# Altium footprint library Metric_SMD.PcbLib: 185 footprints (part 3 of 12)
Each footprint in its own frame and in the unit in brackets; x right, y up, seen from the top. Pads: shape width x height; smd on the part's side, far side on the other; paste and mask are expansions set on the pad; w line width, h text height; cw(c..) or ccw(c..) is an arc to the next point about the centre after c.
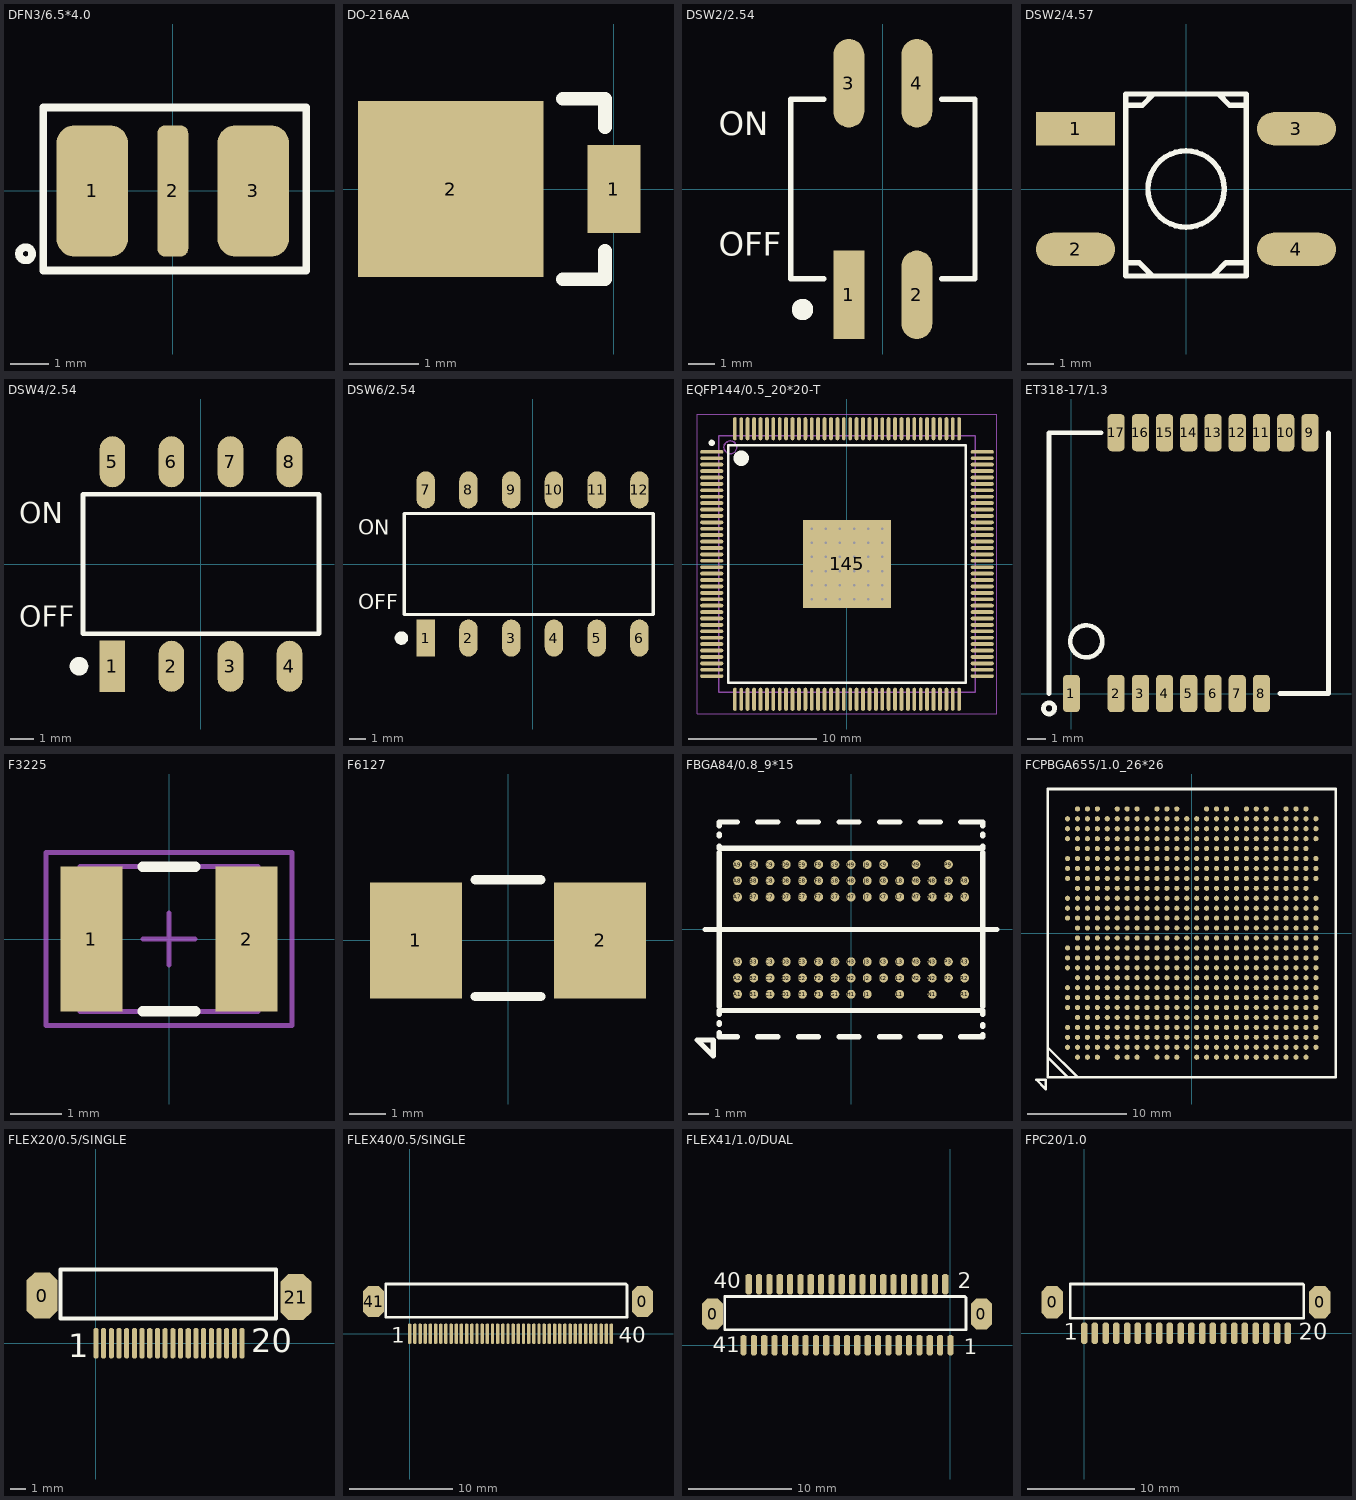
[diagram p2: the footprints below, top view; thin cyan lines are the x and y axes]

## DFN3/6.5*4.0 [mm] "TBU高速保护管,6.5*4.0mm,3pin"
height 0.9
pads (3):
  rrect50% 1.85x3.4 smd: 1(-2.083,0) 3(2.083,0)
  rrect50% 0.8x3.4 smd: 2(0,0)
Top Overlay:
  circle w0.2: c-3.81,-1.626 r0.17
  lines w0.2: -3.353,-2.057 3.454,-2.057 3.454,2.159 -3.353,2.159 -3.353,-2.057
3D body: height 2.2, standoff 0.2, extent -3.245,-1.88 3.327,1.956

## DO-216AA [mm]
pads (2):
  rect 0.762x1.27 smd: 1(0,0)
  rect 2.67x2.54 smd: 2(-2.351,0)
Top Overlay:
  lines w0.2: -0.737,-1.3 -0.127,-1.3 -0.127,-0.889 ; -0.737,1.3 -0.127,1.3 -0.127,0.889

## DSW2/2.54 [mm]
height 4.4
pads (4):
  rect 1.15x3.3 smd: 1(-1.27,-3.95)
  oval 1.15x3.3 smd: 2(1.27,-3.95) 3(-1.27,3.95) 4(1.27,3.95)
Top Overlay:
  circle w0.4: c-3,-4.5 r0.2
  lines w0.2: -2.2,-3.35 -3.44,-3.35 -3.44,3.35 -2.2,3.35 ; 2.2,-3.35 3.44,-3.35 3.44,3.35 2.2,3.35
  text "OFF" at -6.119,-2.5 h0.89
  text "ON" at -6.119,2 h0.89

## DSW2/4.57 [mil]
pads (4):
  rect 118.11x49.37 smd: 1(-165,90)
  oval 118.11x49.37 smd: 2(-165,-90) 3(165,90) 4(165,-90)
Top Overlay:
  circle w7.87: c0.08,0 r57.01
  lines w7.87: -89.99,-110 -70,-110 -50,-130 ; -89.99,125 -65.39,125 -49.28,141.1 ; -89.99,140.39 -89.99,-130 90.01,-130 90.01,141.81 -89.99,141.81 ; 42.31,-127.3 59.62,-110 90.01,-110 ; 49.3,141.1 65.4,125 90.01,125
3D body "User Library-KT11P2SM.STEP": height 216.54, standoff -1.14, extent -195.12,-125.73 199.91,124.02

## DSW4/2.54 [mm] "Body 10.16*6mm"
height 4.55
pads (8):
  rect 1.1x2.2 smd: 1(-3.81,-4.4)
  oval 1.1x2.2 smd: 2(-1.27,-4.4) 3(1.27,-4.4) 4(3.81,-4.4) 5(-3.81,4.4) 6(-1.27,4.4) 7(1.27,4.4) 8(3.81,4.4)
Top Overlay:
  circle w0.4: c-5.25,-4.4 r0.2
  lines w0.2: -5.08,-3 -5.08,3 5.08,3 5.08,-3 -5.08,-3
  text "OFF" at -7.832,-2.7 h0.89
  text "ON" at -7.832,1.75 h0.89

## DSW6/2.54 [mm] "Body 15.24*6mm"
height 4.55
pads (12):
  rect 1.1x2.2 smd: 1(-6.35,-4.4)
  oval 1.1x2.2 smd: 2(-3.81,-4.4) 3(-1.27,-4.4) 4(1.27,-4.4) 5(3.81,-4.4) 6(6.35,-4.4) 7(-6.35,4.4) 8(-3.81,4.4) 9(-1.27,4.4) 10(1.27,4.4) 11(3.81,4.4) 12(6.35,4.4)
Top Overlay:
  circle w0.4: c-7.79,-4.4 r0.2
  lines w0.2: -7.62,-3 -7.62,3 7.17,3 7.17,-3 -7.62,-3
  text "OFF" at -10.372,-2.7 h0.89
  text "ON" at -10.372,1.75 h0.89

## EQFP144/0.5_20*20-T [mm] "Shrink QFP, 144-Leads, Body 20x20mm, Pitch 0.5mm, Thermal Pad 6.85x6.85mm, IPC Medium Density"
height 1.65
pads (145):
  oval 1.8x0.3 smd: 1(-10.55,8.75) 2(-10.55,8.25) 3(-10.55,7.75) 4(-10.55,7.25) 5(-10.55,6.75) 6(-10.55,6.25) 7(-10.55,5.75) 8(-10.55,5.25) 9(-10.55,4.75) 10(-10.55,4.25) 11(-10.55,3.75) 12(-10.55,3.25) 13(-10.55,2.75) 14(-10.55,2.25) 15(-10.55,1.75) 16(-10.55,1.25) 17(-10.55,0.75) 18(-10.55,0.25) 19(-10.55,-0.25) 20(-10.55,-0.75) 21(-10.55,-1.25) 22(-10.55,-1.75) 23(-10.55,-2.25) 24(-10.55,-2.75) 25(-10.55,-3.25) 26(-10.55,-3.75) 27(-10.55,-4.25) 28(-10.55,-4.75) 29(-10.55,-5.25) 30(-10.55,-5.75) 31(-10.55,-6.25) 32(-10.55,-6.75) 33(-10.55,-7.25) 34(-10.55,-7.75) 35(-10.55,-8.25) 36(-10.55,-8.75) 73(10.55,-8.75) 74(10.55,-8.25) 75(10.55,-7.75) 76(10.55,-7.25) 77(10.55,-6.75) 78(10.55,-6.25) 79(10.55,-5.75) 80(10.55,-5.25) 81(10.55,-4.75) 82(10.55,-4.25) 83(10.55,-3.75) 84(10.55,-3.25) 85(10.55,-2.75) 86(10.55,-2.25) 87(10.55,-1.75) 88(10.55,-1.25) 89(10.55,-0.75) 90(10.55,-0.25) 91(10.55,0.25) 92(10.55,0.75) 93(10.55,1.25) 94(10.55,1.75) 95(10.55,2.25) 96(10.55,2.75) 97(10.55,3.25) 98(10.55,3.75) 99(10.55,4.25) 100(10.55,4.75) 101(10.55,5.25) 102(10.55,5.75) 103(10.55,6.25) 104(10.55,6.75) 105(10.55,7.25) 106(10.55,7.75) 107(10.55,8.25) 108(10.55,8.75)
  oval 0.3x1.8 smd: 37(-8.75,-10.55) 38(-8.25,-10.55) 39(-7.75,-10.55) 40(-7.25,-10.55) 41(-6.75,-10.55) 42(-6.25,-10.55) 43(-5.75,-10.55) 44(-5.25,-10.55) 45(-4.75,-10.55) 46(-4.25,-10.55) 47(-3.75,-10.55) 48(-3.25,-10.55) 49(-2.75,-10.55) 50(-2.25,-10.55) 51(-1.75,-10.55) 52(-1.25,-10.55) 53(-0.75,-10.55) 54(-0.25,-10.55) 55(0.25,-10.55) 56(0.75,-10.55) 57(1.25,-10.55) 58(1.75,-10.55) 59(2.25,-10.55) 60(2.75,-10.55) 61(3.25,-10.55) 62(3.75,-10.55) 63(4.25,-10.55) 64(4.75,-10.55) 65(5.25,-10.55) 66(5.75,-10.55) 67(6.25,-10.55) 68(6.75,-10.55) 69(7.25,-10.55) 70(7.75,-10.55) 71(8.25,-10.55) 72(8.75,-10.55) 109(8.75,10.55) 110(8.25,10.55) 111(7.75,10.55) 112(7.25,10.55) 113(6.75,10.55) 114(6.25,10.55) 115(5.75,10.55) 116(5.25,10.55) 117(4.75,10.55) 118(4.25,10.55) 119(3.75,10.55) 120(3.25,10.55) 121(2.75,10.55) 122(2.25,10.55) 123(1.75,10.55) 124(1.25,10.55) 125(0.75,10.55) 126(0.25,10.55) 127(-0.25,10.55) 128(-0.75,10.55) 129(-1.25,10.55) 130(-1.75,10.55) 131(-2.25,10.55) 132(-2.75,10.55) 133(-3.25,10.55) 134(-3.75,10.55) 135(-4.25,10.55) 136(-4.75,10.55) 137(-5.25,10.55) 138(-5.75,10.55) 139(-6.25,10.55) 140(-6.75,10.55) 141(-7.25,10.55) 142(-7.75,10.55) 143(-8.25,10.55) 144(-8.75,10.55)
  rect 6.85x6.85 smd: 145(0,0)
via 2.75,-2.75 diameter 0.5 hole 0.2
via 1.65,-2.75 diameter 0.5 hole 0.2
via 0.55,-2.75 diameter 0.5 hole 0.2
via -0.55,-2.75 diameter 0.5 hole 0.2
via -1.65,-2.75 diameter 0.5 hole 0.2
via -2.75,-2.75 diameter 0.5 hole 0.2
via 2.75,-1.65 diameter 0.5 hole 0.2
via 1.65,-1.65 diameter 0.5 hole 0.2
via 0.55,-1.65 diameter 0.5 hole 0.2
via -0.55,-1.65 diameter 0.5 hole 0.2
via -1.65,-1.65 diameter 0.5 hole 0.2
via -2.75,-1.65 diameter 0.5 hole 0.2
via 2.75,-0.55 diameter 0.5 hole 0.2
via 1.65,-0.55 diameter 0.5 hole 0.2
via 0.55,-0.55 diameter 0.5 hole 0.2
via -0.55,-0.55 diameter 0.5 hole 0.2
via -1.65,-0.55 diameter 0.5 hole 0.2
via -2.75,-0.55 diameter 0.5 hole 0.2
via 2.75,0.55 diameter 0.5 hole 0.2
via 1.65,0.55 diameter 0.5 hole 0.2
via 0.55,0.55 diameter 0.5 hole 0.2
via -0.55,0.55 diameter 0.5 hole 0.2
via -1.65,0.55 diameter 0.5 hole 0.2
via -2.75,0.55 diameter 0.5 hole 0.2
via 2.75,1.65 diameter 0.5 hole 0.2
via 1.65,1.65 diameter 0.5 hole 0.2
via 0.55,1.65 diameter 0.5 hole 0.2
via -0.55,1.65 diameter 0.5 hole 0.2
via -1.65,1.65 diameter 0.5 hole 0.2
via -2.75,1.65 diameter 0.5 hole 0.2
via 2.75,2.75 diameter 0.5 hole 0.2
via 1.65,2.75 diameter 0.5 hole 0.2
via 0.55,2.75 diameter 0.5 hole 0.2
via -0.55,2.75 diameter 0.5 hole 0.2
via -1.65,2.75 diameter 0.5 hole 0.2
via -2.75,2.75 diameter 0.5 hole 0.2
Top Overlay:
  circle w0.25: c-10.55,9.45 r0.125
  circle w0.6: c-8.25,8.25 r0.3
  lines w0.2: -9.25,-9.25 -9.25,9.25 9.25,9.25 9.25,-9.25 -9.25,-9.25
Mechanical 13:
  circle w0.1: c-9.1,9.1 r0.5
  lines w0.1: -10,-10 -10,10 10,10 10,-10 -10,-10
Mechanical 15:
  lines w0.05: -11.7,-11.7 -11.7,11.7 11.7,11.7 11.7,-11.7 -11.7,-11.7
  lines w0.1: -0.5,0 0.5,0 ; 0,-0.5 0,0.5
3D body: height 1.65, standoff 0.05, extent -10,-10 10,10

## ET318-17/1.3 [mm] "ET318 GPS模块pitch=1.3mm"
height 1
pads (17):
  rrect50% 0.92x2 smd: 1(0,0) 2(2.4,0) 3(3.7,0) 4(5,0) 5(6.3,0) 6(7.6,0) 7(8.9,0) 8(10.2,0) 9(12.8,14) 10(11.5,14) 11(10.2,14) 12(8.9,14) 13(7.6,14) 14(6.3,14) 15(5,14) 16(3.7,14) 17(2.4,14)
Top Overlay:
  circle w0.254: c0.8,2.8 r0.86
  lines w0.254: -1.2,0 -1.2,14 1.6,14 ; -0.901,-0.773 ccw(c-1.2,-0.8) -0.9,-0.8 ; 11.2,0 13.8,0 13.8,14
3D body: height 1, standoff 0.01, extent -1.1,0.1 13.7,13.9
3D body: height 1.02, standoff 0.01, extent 3.19,7.3 9.9,11.046

## F3225 [mm] "Body 3.43*2.8(MAX)"
height 0.85
pads (2):
  rect 1.2x2.8 smd: 1(-1.5,0) 2(1.5,0)
Top Overlay:
  lines w0.2: -0.508,-1.4 0.508,-1.4 ; -0.508,1.4 0.508,1.4
Mechanical 13:
  lines w0.1: -1.715,-1.4 -1.715,1.4 1.715,1.4 1.715,-1.4 -1.715,-1.4
Mechanical 15:
  lines w0.1: -0.5,0 0.5,0 ; 0,-0.5 0,0.5 ; -2.375,-1.675 -2.375,1.675 2.375,1.675 2.375,-1.675 -2.375,-1.675
3D body: height 0.85, standoff 0, extent -1.715,-1.4 1.715,1.4

## F6127 [mm] "Body 6.1*2.69"
height 2.94
pads (2):
  rect 2.5x3.15 smd: 1(-2.5,0) 2(2.5,0)
Top Overlay:
  lines w0.254: -0.889,-1.524 0.889,-1.524 ; -0.889,1.651 0.889,1.651
3D body "User Library-FUSE_NANO2.STEP": height 2.7, standoff 0, extent -3.01,-1.34 3.09,1.36

## FBGA84/0.8_9*15 [mm] "0.8mm间距"
height 1.5
pads (84):
  round 0.44 smd: A1(-5.6,-3.2) A2(-5.6,-2.4) A3(-5.6,-1.6) A7(-5.6,1.6) A8(-5.6,2.4) A9(-5.6,3.2) B1(-4.8,-3.2) B2(-4.8,-2.4) B3(-4.8,-1.6) B7(-4.8,1.6) B8(-4.8,2.4) B9(-4.8,3.2) C1(-4,-3.2) C2(-4,-2.4) C3(-4,-1.6) C7(-4,1.6) C8(-4,2.4) C9(-4,3.2) D1(-3.2,-3.2) D2(-3.2,-2.4) D3(-3.2,-1.6) D7(-3.2,1.6) D8(-3.2,2.4) D9(-3.2,3.2) E1(-2.4,-3.2) E2(-2.4,-2.4) E3(-2.4,-1.6) E7(-2.4,1.6) E8(-2.4,2.4) E9(-2.4,3.2) F1(-1.6,-3.2) F2(-1.6,-2.4) F3(-1.6,-1.6) F7(-1.6,1.6) F8(-1.6,2.4) F9(-1.6,3.2) G1(-0.8,-3.2) G2(-0.8,-2.4) G3(-0.8,-1.6) G7(-0.8,1.6) G8(-0.8,2.4) G9(-0.8,3.2) H1(0,-3.2) H2(0,-2.4) H3(0,-1.6) H7(0,1.6) H8(0,2.4) H9(0,3.2) J1(0.8,-3.2) J2(0.8,-2.4) J3(0.8,-1.6) J7(0.8,1.6) J8(0.8,2.4) J9(0.8,3.2) K2(1.6,-2.4) K3(1.6,-1.6) K7(1.6,1.6) K8(1.6,2.4) K9(1.6,3.2) L1(2.4,-3.2) L2(2.4,-2.4) L3(2.4,-1.6) L7(2.4,1.6) L8(2.4,2.4) M2(3.2,-2.4) M3(3.2,-1.6) M7(3.2,1.6) M8(3.2,2.4) M9(3.2,3.2) N1(4,-3.2) N2(4,-2.4) N3(4,-1.6) N7(4,1.6) N8(4,2.4) P2(4.8,-2.4) P3(4.8,-1.6) P7(4.8,1.6) P8(4.8,2.4) P9(4.8,3.2) R1(5.6,-3.2) R2(5.6,-2.4) R3(5.6,-1.6) R7(5.6,1.6) R8(5.6,2.4)
Top Overlay:
  lines w0.254: -7.2,0 7.2,0 ; -6.5,-5.1 -6.5,-5.3 -5.6,-5.3 ; -6.5,-4.7 -6.5,-4.6 ; -6.5,-4.2 -6.5,-4 6.5,-4 6.5,-4.2 ; -6.5,-3.8 -6.5,3.8 ; -6.5,4.1 -6.5,4 6.5,4 6.5,4.1 ; -6.5,4.6 -6.5,4.7 ; -6.5,5.1 -6.5,5.3 -5.6,5.3 ; -4.6,-5.3 -3.6,-5.3 ; -4.6,5.3 -3.6,5.3 ; -2.6,-5.3 -1.6,-5.3 ; -2.6,5.3 -1.6,5.3 ; -0.6,-5.3 0.4,-5.3 ; -0.6,5.3 0.4,5.3 ; 1.4,-5.3 2.4,-5.3 ; 1.4,5.3 2.4,5.3 ; 3.4,-5.3 4.4,-5.3 ; 3.4,5.3 4.4,5.3 ; 5.4,-5.3 6.5,-5.3 6.5,-5.2 ; 5.4,5.3 6.5,5.3 6.5,5.1 ; 6.5,-4.8 6.5,-4.7 ; 6.5,-3.8 6.5,3.8 ; 6.5,4.6 6.5,4.7 ; -7.6,-5.45 -6.8,-6.25 -6.8,-5.45 -7.6,-5.45
3D body: height 1.6, standoff 0.2, extent -6.5,-5.3 6.5,5.3

## FCPBGA655/1.0_26*26 [mm] "1mm间距,27x27"
height 1
pads (655):
  round 0.52 smd: A2(-12.5,-11.5) A3(-12.5,-10.5) A4(-12.5,-9.5) A6(-12.5,-7.5) A7(-12.5,-6.5) A8(-12.5,-5.5) A10(-12.5,-3.5) A11(-12.5,-2.5) A12(-12.5,-1.5) A15(-12.5,1.5) A16(-12.5,2.5) A17(-12.5,3.5) A19(-12.5,5.5) A20(-12.5,6.5) A21(-12.5,7.5) A23(-12.5,9.5) A24(-12.5,10.5) A25(-12.5,11.5) AA1(7.5,-12.5) AA2(7.5,-11.5) AA3(7.5,-10.5) AA4(7.5,-9.5) AA5(7.5,-8.5) AA6(7.5,-7.5) AA7(7.5,-6.5) AA8(7.5,-5.5) AA9(7.5,-4.5) AA10(7.5,-3.5) AA11(7.5,-2.5) AA12(7.5,-1.5) AA13(7.5,-0.5) AA14(7.5,0.5) AA15(7.5,1.5) AA16(7.5,2.5) AA17(7.5,3.5) AA18(7.5,4.5) AA19(7.5,5.5) AA20(7.5,6.5) AA21(7.5,7.5) AA22(7.5,8.5) AA23(7.5,9.5) AA24(7.5,10.5) AA25(7.5,11.5) AA26(7.5,12.5) AB1(8.5,-12.5) AB2(8.5,-11.5) AB3(8.5,-10.5) AB4(8.5,-9.5) AB5(8.5,-8.5) AB6(8.5,-7.5) AB7(8.5,-6.5) AB8(8.5,-5.5) AB9(8.5,-4.5) AB10(8.5,-3.5) AB11(8.5,-2.5) AB12(8.5,-1.5) AB13(8.5,-0.5) AB14(8.5,0.5) AB15(8.5,1.5) AB16(8.5,2.5) AB17(8.5,3.5) AB18(8.5,4.5) AB19(8.5,5.5) AB20(8.5,6.5) AB21(8.5,7.5) AB22(8.5,8.5) AB23(8.5,9.5) AB24(8.5,10.5) AB25(8.5,11.5) AC1(9.5,-12.5) AC2(9.5,-11.5) AC3(9.5,-10.5) AC4(9.5,-9.5) AC5(9.5,-8.5) AC6(9.5,-7.5) AC7(9.5,-6.5) AC8(9.5,-5.5) AC9(9.5,-4.5) AC10(9.5,-3.5) AC11(9.5,-2.5) AC12(9.5,-1.5) AC13(9.5,-0.5) AC14(9.5,0.5) AC15(9.5,1.5) AC16(9.5,2.5) AC17(9.5,3.5) AC18(9.5,4.5) AC19(9.5,5.5) AC20(9.5,6.5) AC21(9.5,7.5) AC22(9.5,8.5) AC23(9.5,9.5) AC24(9.5,10.5) AC25(9.5,11.5) AC26(9.5,12.5) AD1(10.5,-12.5) AD2(10.5,-11.5) AD3(10.5,-10.5) AD4(10.5,-9.5) AD5(10.5,-8.5) AD6(10.5,-7.5) AD7(10.5,-6.5) AD8(10.5,-5.5) AD9(10.5,-4.5) AD10(10.5,-3.5) AD11(10.5,-2.5) AD12(10.5,-1.5) AD13(10.5,-0.5) AD14(10.5,0.5) AD15(10.5,1.5) AD16(10.5,2.5) AD17(10.5,3.5) AD18(10.5,4.5) AD19(10.5,5.5) AD20(10.5,6.5) AD21(10.5,7.5) AD22(10.5,8.5) AD23(10.5,9.5) AD24(10.5,10.5) AD25(10.5,11.5) AD26(10.5,12.5) AE1(11.5,-12.5) AE2(11.5,-11.5) AE3(11.5,-10.5) AE4(11.5,-9.5) AE5(11.5,-8.5) AE6(11.5,-7.5) AE7(11.5,-6.5) AE8(11.5,-5.5) AE9(11.5,-4.5) AE10(11.5,-3.5) AE11(11.5,-2.5) AE12(11.5,-1.5) AE13(11.5,-0.5) AE14(11.5,0.5) AE15(11.5,1.5) AE16(11.5,2.5) AE17(11.5,3.5) AE18(11.5,4.5) AE19(11.5,5.5) AE20(11.5,6.5) AE21(11.5,7.5) AE22(11.5,8.5) AE23(11.5,9.5) AE24(11.5,10.5) AE25(11.5,11.5) AE26(11.5,12.5) AF2(12.5,-11.5) AF3(12.5,-10.5) AF4(12.5,-9.5) AF5(12.5,-8.5) AF6(12.5,-7.5) AF7(12.5,-6.5) AF8(12.5,-5.5) AF9(12.5,-4.5) AF10(12.5,-3.5) AF11(12.5,-2.5) AF12(12.5,-1.5) AF13(12.5,-0.5) AF14(12.5,0.5) AF15(12.5,1.5) AF16(12.5,2.5) AF17(12.5,3.5) AF19(12.5,5.5) AF20(12.5,6.5) AF21(12.5,7.5) AF23(12.5,9.5) AF24(12.5,10.5) AF25(12.5,11.5) B1(-11.5,-12.5) B2(-11.5,-11.5) B3(-11.5,-10.5) B4(-11.5,-9.5) B5(-11.5,-8.5) B6(-11.5,-7.5) B7(-11.5,-6.5) B8(-11.5,-5.5) B9(-11.5,-4.5) B10(-11.5,-3.5) B11(-11.5,-2.5) B12(-11.5,-1.5) B13(-11.5,-0.5) B14(-11.5,0.5) B15(-11.5,1.5) B16(-11.5,2.5) B17(-11.5,3.5) B18(-11.5,4.5) B19(-11.5,5.5) B20(-11.5,6.5) B21(-11.5,7.5) B22(-11.5,8.5) B23(-11.5,9.5) B24(-11.5,10.5) B25(-11.5,11.5) B26(-11.5,12.5) C1(-10.5,-12.5) C2(-10.5,-11.5) C3(-10.5,-10.5) C4(-10.5,-9.5) C5(-10.5,-8.5) C6(-10.5,-7.5) C7(-10.5,-6.5) C8(-10.5,-5.5) C9(-10.5,-4.5) C10(-10.5,-3.5) C11(-10.5,-2.5) C12(-10.5,-1.5) C13(-10.5,-0.5) C14(-10.5,0.5) C15(-10.5,1.5) C16(-10.5,2.5) C17(-10.5,3.5) C18(-10.5,4.5) C19(-10.5,5.5) C20(-10.5,6.5) C21(-10.5,7.5) C22(-10.5,8.5) C23(-10.5,9.5) C24(-10.5,10.5) C25(-10.5,11.5) C26(-10.5,12.5) D1(-9.5,-12.5) D2(-9.5,-11.5) D3(-9.5,-10.5) D4(-9.5,-9.5) D5(-9.5,-8.5) D6(-9.5,-7.5) D7(-9.5,-6.5) D8(-9.5,-5.5) D9(-9.5,-4.5) D10(-9.5,-3.5) D11(-9.5,-2.5) D12(-9.5,-1.5) D13(-9.5,-0.5) D14(-9.5,0.5) D15(-9.5,1.5) D16(-9.5,2.5) D17(-9.5,3.5) D18(-9.5,4.5) D19(-9.5,5.5) D20(-9.5,6.5) D21(-9.5,7.5) D22(-9.5,8.5) D23(-9.5,9.5) D24(-9.5,10.5) D25(-9.5,11.5) D26(-9.5,12.5) E2(-8.5,-11.5) E3(-8.5,-10.5) E4(-8.5,-9.5) E5(-8.5,-8.5) E6(-8.5,-7.5) E7(-8.5,-6.5) E8(-8.5,-5.5) E9(-8.5,-4.5) E10(-8.5,-3.5) E11(-8.5,-2.5) E12(-8.5,-1.5) E13(-8.5,-0.5) E14(-8.5,0.5) E15(-8.5,1.5) E16(-8.5,2.5) E17(-8.5,3.5) E18(-8.5,4.5) E19(-8.5,5.5) E20(-8.5,6.5) E21(-8.5,7.5) E22(-8.5,8.5) E23(-8.5,9.5) E24(-8.5,10.5) E25(-8.5,11.5) F1(-7.5,-12.5) F2(-7.5,-11.5) F3(-7.5,-10.5) F4(-7.5,-9.5) F5(-7.5,-8.5) F6(-7.5,-7.5) F7(-7.5,-6.5) F8(-7.5,-5.5) F9(-7.5,-4.5) F10(-7.5,-3.5) F11(-7.5,-2.5) F12(-7.5,-1.5) F13(-7.5,-0.5) F14(-7.5,0.5) F15(-7.5,1.5) F16(-7.5,2.5) F17(-7.5,3.5) F18(-7.5,4.5) F19(-7.5,5.5) F20(-7.5,6.5) F21(-7.5,7.5) F22(-7.5,8.5) F23(-7.5,9.5) F24(-7.5,10.5) F25(-7.5,11.5) F26(-7.5,12.5) G1(-6.5,-12.5) G2(-6.5,-11.5) G3(-6.5,-10.5) G4(-6.5,-9.5) G5(-6.5,-8.5) G6(-6.5,-7.5) G7(-6.5,-6.5) G8(-6.5,-5.5) G9(-6.5,-4.5) G10(-6.5,-3.5) G11(-6.5,-2.5) G12(-6.5,-1.5) G13(-6.5,-0.5) G14(-6.5,0.5) G15(-6.5,1.5) G16(-6.5,2.5) G17(-6.5,3.5) G18(-6.5,4.5) G19(-6.5,5.5) G20(-6.5,6.5) G21(-6.5,7.5) G22(-6.5,8.5) G23(-6.5,9.5) G24(-6.5,10.5) G25(-6.5,11.5) G26(-6.5,12.5) H1(-5.5,-12.5) H2(-5.5,-11.5) H3(-5.5,-10.5) H4(-5.5,-9.5) H5(-5.5,-8.5) H6(-5.5,-7.5) H7(-5.5,-6.5) H8(-5.5,-5.5) H9(-5.5,-4.5) H10(-5.5,-3.5) H11(-5.5,-2.5) H12(-5.5,-1.5) H13(-5.5,-0.5) H14(-5.5,0.5) H15(-5.5,1.5) H16(-5.5,2.5) H17(-5.5,3.5) H18(-5.5,4.5) H19(-5.5,5.5) H20(-5.5,6.5) H21(-5.5,7.5) H22(-5.5,8.5) H23(-5.5,9.5) H24(-5.5,10.5) H25(-5.5,11.5) H26(-5.5,12.5) J2(-4.5,-11.5) J3(-4.5,-10.5) J4(-4.5,-9.5) J5(-4.5,-8.5) J6(-4.5,-7.5) J7(-4.5,-6.5) J8(-4.5,-5.5) J9(-4.5,-4.5) J10(-4.5,-3.5) J11(-4.5,-2.5) J12(-4.5,-1.5) J13(-4.5,-0.5) J14(-4.5,0.5) J15(-4.5,1.5) J16(-4.5,2.5) J17(-4.5,3.5) J18(-4.5,4.5) J19(-4.5,5.5) J20(-4.5,6.5) J21(-4.5,7.5) J22(-4.5,8.5) J23(-4.5,9.5) J24(-4.5,10.5) J25(-4.5,11.5) K1(-3.5,-12.5) K2(-3.5,-11.5) K3(-3.5,-10.5) K4(-3.5,-9.5) K5(-3.5,-8.5) K6(-3.5,-7.5) K7(-3.5,-6.5) K8(-3.5,-5.5) K9(-3.5,-4.5) K10(-3.5,-3.5) K11(-3.5,-2.5) K12(-3.5,-1.5) K13(-3.5,-0.5) K14(-3.5,0.5) K15(-3.5,1.5) K16(-3.5,2.5) K17(-3.5,3.5) K18(-3.5,4.5) K19(-3.5,5.5) K20(-3.5,6.5) K21(-3.5,7.5) K22(-3.5,8.5) K23(-3.5,9.5) K24(-3.5,10.5) K25(-3.5,11.5) K26(-3.5,12.5) L1(-2.5,-12.5) L2(-2.5,-11.5) L3(-2.5,-10.5) L4(-2.5,-9.5) L5(-2.5,-8.5) L6(-2.5,-7.5) L7(-2.5,-6.5) L8(-2.5,-5.5) L9(-2.5,-4.5) L10(-2.5,-3.5) L11(-2.5,-2.5) L12(-2.5,-1.5) L13(-2.5,-0.5) L14(-2.5,0.5) L15(-2.5,1.5) L16(-2.5,2.5) L17(-2.5,3.5) L18(-2.5,4.5) L19(-2.5,5.5) L20(-2.5,6.5) L21(-2.5,7.5) L22(-2.5,8.5) L23(-2.5,9.5) L24(-2.5,10.5) L25(-2.5,11.5) L26(-2.5,12.5) M1(-1.5,-12.5) M2(-1.5,-11.5) M3(-1.5,-10.5) M4(-1.5,-9.5) M5(-1.5,-8.5) M6(-1.5,-7.5) M7(-1.5,-6.5) M8(-1.5,-5.5) M9(-1.5,-4.5) M10(-1.5,-3.5) M11(-1.5,-2.5) M12(-1.5,-1.5) M13(-1.5,-0.5) M14(-1.5,0.5) M15(-1.5,1.5) M16(-1.5,2.5) M17(-1.5,3.5) M18(-1.5,4.5) M19(-1.5,5.5) M20(-1.5,6.5) M21(-1.5,7.5) M22(-1.5,8.5) M23(-1.5,9.5) M24(-1.5,10.5) M25(-1.5,11.5) M26(-1.5,12.5) N2(-0.5,-11.5) N3(-0.5,-10.5) N4(-0.5,-9.5) N5(-0.5,-8.5) N6(-0.5,-7.5) N7(-0.5,-6.5) N8(-0.5,-5.5) N9(-0.5,-4.5) N10(-0.5,-3.5) N11(-0.5,-2.5) N12(-0.5,-1.5) N13(-0.5,-0.5) N14(-0.5,0.5) N15(-0.5,1.5) N16(-0.5,2.5) N17(-0.5,3.5) N18(-0.5,4.5) N19(-0.5,5.5) N20(-0.5,6.5) N21(-0.5,7.5) N22(-0.5,8.5) N23(-0.5,9.5) N24(-0.5,10.5) N25(-0.5,11.5) P1(0.5,-12.5) P2(0.5,-11.5) P3(0.5,-10.5) P4(0.5,-9.5) P5(0.5,-8.5) P6(0.5,-7.5) P7(0.5,-6.5) P8(0.5,-5.5) P9(0.5,-4.5) P10(0.5,-3.5) P11(0.5,-2.5) P12(0.5,-1.5) P13(0.5,-0.5) P14(0.5,0.5) P15(0.5,1.5) P16(0.5,2.5) P17(0.5,3.5) P18(0.5,4.5) P19(0.5,5.5) P20(0.5,6.5) P21(0.5,7.5) P22(0.5,8.5) P23(0.5,9.5) P24(0.5,10.5) P25(0.5,11.5) R1(1.5,-12.5) R2(1.5,-11.5) R3(1.5,-10.5) R4(1.5,-9.5) R5(1.5,-8.5) R6(1.5,-7.5) R7(1.5,-6.5) R8(1.5,-5.5) R9(1.5,-4.5) R10(1.5,-3.5) R11(1.5,-2.5) R12(1.5,-1.5) R13(1.5,-0.5) R14(1.5,0.5) R15(1.5,1.5) R16(1.5,2.5) R17(1.5,3.5) R18(1.5,4.5) R19(1.5,5.5) R20(1.5,6.5) R21(1.5,7.5) R22(1.5,8.5) R23(1.5,9.5) R24(1.5,10.5) R25(1.5,11.5) R26(1.5,12.5) T1(2.5,-12.5) T2(2.5,-11.5) T3(2.5,-10.5) T4(2.5,-9.5) T5(2.5,-8.5) T6(2.5,-7.5) T7(2.5,-6.5) T8(2.5,-5.5) T9(2.5,-4.5) T10(2.5,-3.5) T11(2.5,-2.5) T12(2.5,-1.5) T13(2.5,-0.5) T14(2.5,0.5) T15(2.5,1.5) T16(2.5,2.5) T17(2.5,3.5) T18(2.5,4.5) T19(2.5,5.5) T20(2.5,6.5) T21(2.5,7.5) T22(2.5,8.5) T23(2.5,9.5) T24(2.5,10.5) T25(2.5,11.5) T26(2.5,12.5) U1(3.5,-12.5) U2(3.5,-11.5) U3(3.5,-10.5) U4(3.5,-9.5) U5(3.5,-8.5) U6(3.5,-7.5) U7(3.5,-6.5) U8(3.5,-5.5) U9(3.5,-4.5) U10(3.5,-3.5) U11(3.5,-2.5) U12(3.5,-1.5) U13(3.5,-0.5) U14(3.5,0.5) U15(3.5,1.5) U16(3.5,2.5) U17(3.5,3.5) U18(3.5,4.5) U19(3.5,5.5) U20(3.5,6.5) U21(3.5,7.5) U22(3.5,8.5) U23(3.5,9.5) U24(3.5,10.5) U25(3.5,11.5) U26(3.5,12.5) V1(4.5,-12.5) V2(4.5,-11.5) V3(4.5,-10.5) V4(4.5,-9.5) V5(4.5,-8.5) V6(4.5,-7.5) V7(4.5,-6.5) V8(4.5,-5.5) V9(4.5,-4.5) V10(4.5,-3.5) V11(4.5,-2.5) V12(4.5,-1.5) V13(4.5,-0.5) V14(4.5,0.5) V15(4.5,1.5) V16(4.5,2.5) V17(4.5,3.5) V18(4.5,4.5) V19(4.5,5.5) V20(4.5,6.5) V21(4.5,7.5) V22(4.5,8.5) V23(4.5,9.5) V24(4.5,10.5) V25(4.5,11.5) W1(5.5,-12.5) W2(5.5,-11.5) W3(5.5,-10.5) W4(5.5,-9.5) W5(5.5,-8.5) W6(5.5,-7.5) W7(5.5,-6.5) W8(5.5,-5.5) W9(5.5,-4.5) W10(5.5,-3.5) W11(5.5,-2.5) W12(5.5,-1.5) W13(5.5,-0.5) W14(5.5,0.5) W15(5.5,1.5) W16(5.5,2.5) W17(5.5,3.5) W18(5.5,4.5) W19(5.5,5.5) W20(5.5,6.5) W21(5.5,7.5) W22(5.5,8.5) W23(5.5,9.5) W24(5.5,10.5) W25(5.5,11.5) W26(5.5,12.5) Y1(6.5,-12.5) Y2(6.5,-11.5) Y3(6.5,-10.5) Y4(6.5,-9.5) Y5(6.5,-8.5) Y6(6.5,-7.5) Y7(6.5,-6.5) Y8(6.5,-5.5) Y9(6.5,-4.5) Y10(6.5,-3.5) Y11(6.5,-2.5) Y12(6.5,-1.5) Y13(6.5,-0.5) Y14(6.5,0.5) Y15(6.5,1.5) Y16(6.5,2.5) Y17(6.5,3.5) Y18(6.5,4.5) Y19(6.5,5.5) Y20(6.5,6.5) Y21(6.5,7.5) Y22(6.5,8.5) Y23(6.5,9.5) Y24(6.5,10.5) Y25(6.5,11.5) Y26(6.5,12.5)
Top Overlay:
  lines w0.254: -14.5,-12.5 -12.5,-14.5 ; -14.5,-11.5 -11.5,-14.5 ; -15.651,-14.75 -15.65,-14.75 -14.7,-15.7 -14.7,-14.75 -15.651,-14.75 ; -14.5,-14.5 14.5,-14.5 14.5,14.5 -14.5,14.5 -14.5,-14.5
3D body: height 2, standoff 1, extent -12,-11.2 11.6,12.1
3D body: height 1, standoff 0.1, extent -14.3,-14.2 14.3,14.3

## FLEX20/0.5/SINGLE [mm] "薄膜电缆插座，20pin, 0.5mm间距"
height 2
pads (22):
  oct 2x3 smd: 0(-3.5,3.1) 21(13,3)
  oct 0.33x2 smd: 1(0,0) 2(0.5,0) 3(1,0) 4(1.5,0) 5(2,0) 6(2.5,0) 7(3,0) 8(3.5,0) 9(4,0) 10(4.5,0) 11(5,0) 12(5.5,0) 13(6,0) 14(6.5,0) 15(7,0) 16(7.5,0) 17(8,0) 18(8.5,0) 19(9,0) 20(9.5,0)
Top Overlay:
  lines w0.254: -2.3,1.6 11.7,1.6 11.7,4.8 -2.3,4.8 -2.3,1.6
  text "1" at -1.8,-0.9 h1.52
  text "20" at 10.1,-0.6 h1.52
3D body: height 2, standoff 0.1, extent -2.4,1.5 11.6,4.7
3D body: height 2.1, standoff 1.1, extent -2.5,3.6 11.7,5

## FLEX40/0.5/SINGLE [mm] "FLEX 40pin,Single,0.5mm pitch"
height 1.5
pads (42):
  oct 2x3 smd: 0(22.5,3.1) 41(-3.5,3.1)
  oct 0.33x2 smd: 1(0,0) 2(0.5,0) 3(1,0) 4(1.5,0) 5(2,0) 6(2.5,0) 7(3,0) 8(3.5,0) 9(4,0) 10(4.5,0) 11(5,0) 12(5.5,0) 13(6,0) 14(6.5,0) 15(7,0) 16(7.5,0) 17(8,0) 18(8.5,0) 19(9,0) 20(9.5,0) 21(10,0) 22(10.5,0) 23(11,0) 24(11.5,0) 25(12,0) 26(12.5,0) 27(13,0) 28(13.5,0) 29(14,0) 30(14.5,0) 31(15,0) 32(15.5,0) 33(16,0) 34(16.5,0) 35(17,0) 36(17.5,0) 37(18,0) 38(18.5,0) 39(19,0) 40(19.5,0)
Top Overlay:
  lines w0.254: -2.3,1.6 -2.3,4.8 20.9,4.8 21,4.7 21,1.6 -2.3,1.6
  text "1" at -1.8,-0.9 h1.52
  text "40" at 20.2,-0.9 h1.52
3D body: height 2, standoff 0.1, extent -2.4,1.4 21,4.6
3D body: height 2.1, standoff 1.1, extent -2.4,3.5 21.1,4.9

## FLEX41/1.0/DUAL [mm] "FLEX 41pin,Dual, 1.0mm pitch"
height 1.5
pads (43):
  oct 2x3 smd: 0(-23,3) 0(3,3)
  oct 0.6x2 smd: 1(0,0) 2(-0.5,5.9) 3(-1,0) 4(-1.5,5.9) 5(-2,0) 6(-2.5,5.9) 7(-3,0) 8(-3.5,5.9) 9(-4,0) 10(-4.5,5.9) 11(-5,0) 12(-5.5,5.9) 13(-6,0) 14(-6.5,5.9) 15(-7,0) 16(-7.5,5.9) 17(-8,0) 18(-8.5,5.9) 19(-9,0) 20(-9.5,5.9) 21(-10,0) 22(-10.5,5.9) 23(-11,0) 24(-11.5,5.9) 25(-12,0) 26(-12.5,5.9) 27(-13,0) 28(-13.5,5.9) 29(-14,0) 30(-14.5,5.9) 31(-15,0) 32(-15.5,5.9) 33(-16,0) 34(-16.5,5.9) 35(-17,0) 36(-17.5,5.9) 37(-18,0) 38(-18.5,5.9) 39(-19,0) 40(-19.5,5.9) 41(-20,0)
Top Overlay:
  lines w0.254: -21.8,1.5 1.5,1.5 1.5,4.6 1.4,4.7 -21.8,4.7 -21.8,1.5
  text "2" at 0.7,5.5 h1.52
  text "40" at -22.9,5.5 h1.52
  text "41" at -23,-0.7 h1.52
  text "1" at 1.3,-0.9 h1.52

## FPC20/1.0 [mm] "FLEX 20pin, 1.0mm pitch"
height 1.5
pads (22):
  oct 2x3 smd: 0(-3,2.9) 0(22,2.9)
  oct 0.6x2 smd: 1(0,0) 2(1,0) 3(2,0) 4(3,0) 5(4,0) 6(5,0) 7(6,0) 8(7,0) 9(8,0) 10(9,0) 11(10,0) 12(11,0) 13(12,0) 14(13,0) 15(14,0) 16(15,0) 17(16,0) 18(17,0) 19(18,0) 20(19,0)
Top Overlay:
  lines w0.254: -1.3,1.4 -1.3,4.6 20.4,4.6 20.5,4.5 20.5,1.4 -1.3,1.4
  text "1" at -1.9,-0.6 h1.52
  text "20" at 20,-0.6 h1.52
3D body: height 2.1, standoff 1.1, extent -1.2,3.5 20.4,4.9
3D body: height 2, standoff 0.1, extent -1.3,1.4 20.5,4.6